# Altium footprint library kalios.PcbLib: 404 footprints (part 5 of 26)
Each footprint in its own frame and in the unit in brackets; x right, y up, seen from the top. Pads: shape width x height; smd on the part's side, far side on the other; paste and mask are expansions set on the pad; w line width, h text height; cw(c..) or ccw(c..) is an arc to the next point about the centre after c.
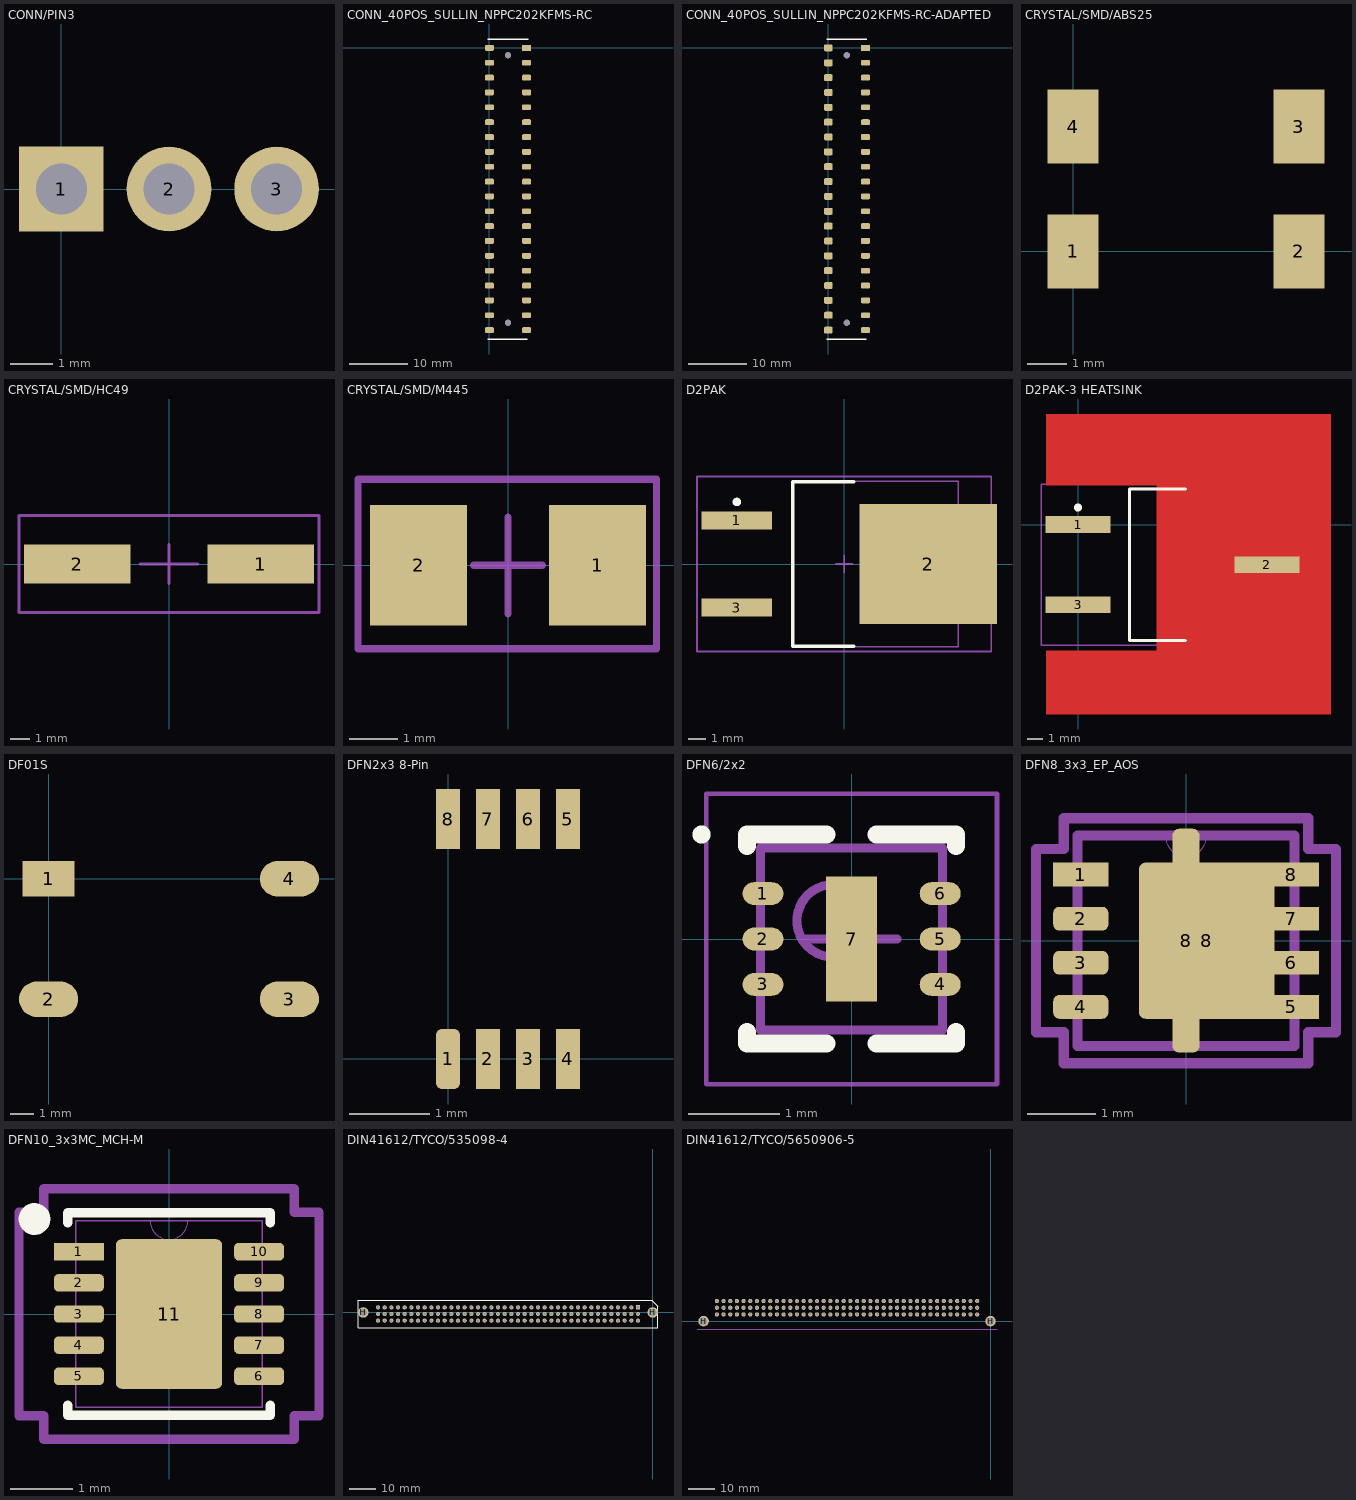
[diagram p4: the footprints below, top view; thin cyan lines are the x and y axes]

## CONN/PIN3 [mm]
pads (3):
  rect 2x2 hole 1.2: 1(0,0)
  round 2 hole 1.2: 2(2.54,0) 3(5.08,0)
Top Designator:
  text ".Designator" at -5.078,-0.508 h1.52

## CONN_40POS_SULLIN_NPPC202KFMS-RC [mm]
pads (42):
  rect 1.56x1 smd: 1(6.35,0)
  rrect50% 1.56x1 smd: 2(0,0) 3(6.35,-2.54) 4(0,-2.54) 5(6.35,-5.08) 6(0,-5.08) 7(6.35,-7.62) 8(0,-7.62) 9(6.35,-10.16) 10(0,-10.16) 11(6.35,-12.7) 12(0,-12.7) 13(6.35,-15.24) 14(0,-15.24) 15(6.35,-17.78) 16(0,-17.78) 17(6.35,-20.32) 18(0,-20.32) 19(6.35,-22.86) 20(0,-22.86) 21(6.35,-25.4) 22(0,-25.4) 23(6.35,-27.94) 24(0,-27.94) 25(6.35,-30.48) 26(0,-30.48) 27(6.35,-33.02) 28(0,-33.02) 29(6.35,-35.56) 30(0,-35.56) 31(6.35,-38.1) 32(0,-38.1) 33(6.35,-40.64) 34(0,-40.64) 35(6.35,-43.18) 36(0,-43.18) 37(6.35,-45.72) 38(0,-45.72) 39(6.35,-48.26) 40(0,-48.26)
  round 1 hole 1.1 unplated: S(3.175,-46.99) S(3.175,-1.27)
Top Overlay:
  lines w0.254: -0.254,-49.784 6.477,-49.784 ; -0.254,1.524 6.604,1.524
Top Designator:
  text ".Designator" at -4.443,-24.638 h1.52
3D body "CONN_40POS_SULLIN_NPPC202KFMS-RC.STEP": height 7.5, standoff 0, extent -0.248,-49.776 6.598,1.524

## CONN_40POS_SULLIN_NPPC202KFMS-RC-ADAPTED [mm]
pads (42):
  rect 1.56x1 smd: 1(6.35,0)
  rrect50% 1.5x1.2 smd: 2(0,0) 4(0,-2.54) 6(0,-5.08) 8(0,-7.62) 10(0,-10.16) 12(0,-12.7) 14(0,-15.24) 16(0,-17.78) 18(0,-20.32) 20(0,-22.86) 22(0,-25.4) 24(0,-27.94) 26(0,-30.48) 28(0,-33.02) 30(0,-35.56) 32(0,-38.1) 34(0,-40.64) 36(0,-43.18) 38(0,-45.72) 40(0,-48.26)
  rrect50% 1.56x1 smd: 3(6.35,-2.54) 5(6.35,-5.08) 7(6.35,-7.62) 9(6.35,-10.16) 11(6.35,-12.7) 13(6.35,-15.24) 15(6.35,-17.78) 17(6.35,-20.32) 19(6.35,-22.86) 21(6.35,-25.4) 23(6.35,-27.94) 25(6.35,-30.48) 27(6.35,-33.02) 29(6.35,-35.56) 31(6.35,-38.1) 33(6.35,-40.64) 35(6.35,-43.18) 37(6.35,-45.72) 39(6.35,-48.26)
  round 1 hole 1.1 unplated: S(3.175,-46.99) S(3.175,-1.27)
Top Overlay:
  lines w0.254: -0.254,-49.784 6.477,-49.784 ; -0.254,1.524 6.604,1.524
Top Designator:
  text ".Designator" at -4.228,-24.638 h1.52
3D body "CONN_40POS_SULLIN_NPPC202KFMS-RC.STEP": height 7.5, standoff 0, extent -0.248,-49.776 6.598,1.524

## CRYSTAL/SMD/ABS25 [mm]
pads (4):
  rect 1.3x1.9 smd: 1(0,0) 2(5.8,0) 3(5.8,3.2) 4(0,3.2)
Top Designator:
  text ".Designator" at -4.759,1.092 h1.52
3D body "ZM206.STEP": height 2.43, standoff -0.1, extent -1.141,-0.362 6.859,3.438

## CRYSTAL/SMD/HC49 [mm]
pads (2):
  rect 5.5x2 smd: 1(4.75,0) 2(-4.75,0)
Top Courtyard:
  lines w0.15: -1.5,0 1.5,0 ; 0,-1 0,1 ; -7.75,-2.5 -7.75,2.5 7.75,2.5 7.75,-2.5 -7.75,-2.5
Top Designator:
  text ".Designator" at -7.618,-0.508 h1.52
3D body "HC49-SMD.STEP": height 2.52, standoff 0.02, extent -6.1,-2.25 6.2,2.25

## CRYSTAL/SMD/M445 [mm]
pads (2):
  rect 2x2.5 smd: 1(1.85,0) 2(-1.85,0)
Top Courtyard:
  lines w0.15: -0.715,0 0.707,0 ; 0,-1.009 0,0.991 ; -3.103,-1.727 -3.103,1.778 3.069,1.778 3.069,-1.727 -3.103,-1.727
Top Designator:
  text ".Designator" at -7.634,-0.482 h1.52
3D body "CRYTAL-SMD.STEP": height 1.35, standoff 0, extent -2.479,-1.574 2.521,1.626

## D2PAK [mm] "D2-PAK, 3-Pads, Body 9.6x9.6mm (max), IPC Medium Density"
height 2.38
pads (3):
  rect 4.1x1.05 smd: 1(-6.25,2.54) 3(-6.25,-2.54)
  rect 8x7 smd: 2(4.902,0)
Top Overlay:
  circle w0.25: c-6.25,3.615 r0.125
  lines w0.2: 0.55,-4.8 -3,-4.8 -3,4.8 0.55,4.8
Top 3D Body:
  lines w0.1: -3,-4.825 6.65,-4.825 6.65,4.825 -3,4.825 -3,-4.825
Top Courtyard:
  lines w0.1: -0.5,0 0.5,0 ; 0,-0.5 0,0.5 ; -8.575,-5.1 8.575,-5.1 8.575,5.1 -8.575,5.1 -8.575,-5.1
Top Designator:
  text ".Designator" at -7.428,-0.508 h1.52
3D body "User Library-DPAK.STEP": height 4.98, standoff -0.03, extent -7.556,-5.08 7.708,5.08

## D2PAK-3 HEATSINK [mm] "D2-PAK, 3-Pads, Body 9.6x9.6mm (max), IPC Medium Density"
height 2.38
pads (3):
  rect 4.1x1.05 smd: 1(0,0) 2(11.963,-2.54) 3(0,-5.08)
Top Layer:
  region: -2,7 16,7 16,-2.5 5,-2.5 5,2.5 -2,2.5
  region: 16,-2.5 16,-12 -2,-12 -2,-8 5,-8 5,-2.5
Top Overlay:
  circle w0.25: c0,1.075 r0.125
  lines w0.2: 6.8,-7.34 3.25,-7.34 3.25,2.26 6.8,2.26
Top Solder:
  region: 16,-2.5 16,-12 -2,-12 -2,-8 5,-8 5,-2.5
  region: -2,7 16,7 16,-2.5 5,-2.5 5,2.5 -2,2.5
Top 3D Body:
  lines w0.1: 3.25,-7.365 3.25,2.285 12.9,2.285 12.9,-7.365 3.25,-7.365
Top Courtyard:
  lines w0.1: 5.75,-2.54 6.75,-2.54 ; 6.25,-3.04 6.25,-2.04 ; -2.325,-7.64 -2.325,2.56 14.825,2.56 14.825,-7.64 -2.325,-7.64
Top Designator:
  text ".Designator" at -0.805,-2.999 h1.52
3D body "D2PAK+DV-T263-101E.STEP": height 10.48, standoff 0.03, extent -1.306,-15.447 13.958,10.464

## DE14MA [mm]
Top Designator:
  text ".Designator" at -7.617,-0.508 h1.52
3D body "DE14MA.STEP": height 0.8, standoff 0, extent -2,-1.51 2,1.51

## DF01S [mm]
pads (4):
  rect 2.2x1.5 smd: 1(0,0)
  oval 2.5x1.5 smd: 2(0,-5.08) 3(10.16,-5.08) 4(10.16,0)
Top Designator:
  text ".Designator" at -2.538,-3.056 h1.52
3D body "SDIP.STEP": height 3.63, standoff 0, extent -0.047,-6.798 9.953,1.702

## DFN2x3 8-Pin [mm]
height 0.9
pads (8):
  rrect50% 0.3x0.75 smd: 1(0,0)
  rect 0.3x0.75 smd: 2(0.5,0) 3(1,0) 4(1.5,0) 5(1.5,3) 6(1,3) 7(0.5,3) 8(0,3)
Top Designator:
  text ".Designator" at -6.867,0.992 h1.52
3D body "DFN2x3 8-Pin.STEP": height 0.9, standoff -0.01, extent -0.247,-0.011 1.753,3.009

## DFN6/2x2 [mm] "QFN, 6-Leads, Body 2.00x2.00mm, Pitch 0.50mm, Thermal Pad 1.37x0.56mm, IPC Medium Density"
height 0.8
pads (7):
  oval 0.45x0.25 smd: 1(-0.975,0.5) 2(-0.975,0) 3(-0.975,-0.5) 4(0.975,-0.5) 5(0.975,0) 6(0.975,0.5)
  rect 0.56x1.37 smd: 7(0,0)
Top Overlay:
  circle w0.1: c-1.65,1.15 r0.05
  lines w0.2: -1.15,-1.025 -1.15,-1.15 -0.275,-1.15 ; -1.15,1.025 -1.15,1.15 -0.275,1.15 ; 0.275,-1.15 1.15,-1.15 1.15,-1.025 ; 0.275,1.15 1.15,1.15 1.15,1.025
Top 3D Body:
  circle w0.1: c-0.2,0.2 r0.4
  lines w0.1: -1,-1 -1,1 1,1 1,-1 -1,-1
Top Courtyard:
  lines w0.05: -1.6,-1.6 -1.6,1.6 1.6,1.6 1.6,-1.6 -1.6,-1.6
  lines w0.1: -0.5,0 0.5,0 ; 0,-0.5 0,0.5
Top Designator:
  text ".Designator" at -7.68,-0.508 h1.52
3D body "DFN-6 2x2mm.STEP": height 0.75, standoff -0.01, extent -1.01,-1 1.01,1

## DFN8_3x3_EP_AOS [mm]
pads (10):
  rect 0.813x0.35 smd paste+0 mask+0: 1(-1.549,0.975) 5(1.549,-0.975) 6(1.549,-0.325) 7(1.549,0.325) 8(1.549,0.975)
  rrect50% 0.813x0.35 smd paste+0 mask+0: 2(-1.549,0.325) 3(-1.549,-0.325)
  rrect50% 0.813x0.35 smd mask+0: 4(-1.549,-0.975)
  rrect50% 0.4x3.3 smd paste+0 mask+0: 8(0,0)
  rrect10% 2x2.3 smd paste+0 mask+0: 8(0.305,0)
Top 3D Body:
  lines w0: -0.305,1.549 ccw(c0,1.549) 0.305,1.549
  lines w0.15: -1.6,-1.549 1.6,-1.549 1.6,1.549 -1.6,1.549 -1.6,-1.549
Top Courtyard:
  lines w0.152: -2.21,-1.351 -2.21,1.351 -1.803,1.351 -1.803,1.803 1.803,1.803 1.803,1.351 2.21,1.351 2.21,-1.351 1.803,-1.351 1.803,-1.803 -1.803,-1.803 -1.803,-1.351 -2.21,-1.351
Top Designator:
  text ".Designator" at -3.499,-0.233 h0.7
3D body: height 0.25, standoff 0, extent 0,0 0.254,0.254
3D body "User Library-DFN8_3x3_0_65Pitch.STEP": height 0.8, standoff 0, extent -1.6,-1.55 1.6,1.55

## DFN10_3x3MC_MCH-M [mm]
pads (11):
  rect 0.8x0.28 smd paste+0 mask+0: 1(-1.445,1)
  rrect50% 0.8x0.28 smd paste+0 mask+0: 2(-1.445,0.5) 3(-1.445,0) 4(-1.445,-0.5) 5(-1.445,-1) 6(1.445,-1) 7(1.445,-0.5) 8(1.445,0) 9(1.445,0.5) 10(1.445,1)
  rrect10% 1.7x2.4 smd paste+0 mask+0: 11(0,0)
Top Overlay:
  circle w0.254: c-2.159,1.524 r0.127
  lines w0.152: -1.626,-1.46 -1.626,-1.626 1.626,-1.626 1.626,-1.46 ; -1.626,1.46 -1.626,1.626 1.626,1.626 1.626,1.46
Top 3D Body:
  lines w0: -0.305,1.499 ccw(c0,1.499) 0.305,1.499
  lines w0.025: -1.499,-1.499 -1.499,1.499 1.499,1.499 1.499,-1.499 -1.499,-1.499
Top Courtyard:
  lines w0.152: -2.407,-1.635 -2.007,-1.635 -2.007,-2.007 2.007,-2.007 2.007,-1.635 2.407,-1.635 2.407,1.635 2.007,1.635 2.007,2.007 -2.007,2.007 -2.007,1.635 -2.407,1.635 -2.407,-1.635
Top Designator:
  text ".Designator" at -7.618,-0.508 h1.52
3D body "DFN10_3x3MC_MCH.step": height -0.42, standoff -1.36, extent -1.499,-1.499 1.499,1.499

## DIN41612/TYCO/535098-4 [mm]
pads (122):
  rect 1.6x1.6 hole 1: A1(-5.613,1.956)
  round 1.6 hole 1: A2(-8.153,1.956) A3(-10.693,1.956) A4(-13.233,1.956) A5(-15.773,1.956) A6(-18.313,1.956) A7(-20.853,1.956) A8(-23.393,1.956) A9(-25.933,1.956) A10(-28.473,1.956) A11(-31.013,1.956) A12(-33.553,1.956) A13(-36.093,1.956) A14(-38.633,1.956) A15(-41.173,1.956) A16(-43.713,1.956) A17(-46.253,1.956) A18(-48.793,1.956) A19(-51.333,1.956) A20(-53.873,1.956) A21(-56.413,1.956) A22(-58.953,1.956) A23(-61.493,1.956) A24(-64.033,1.956) A25(-66.573,1.956) A26(-69.113,1.956) A27(-71.653,1.956) A28(-74.193,1.956) A29(-76.733,1.956) A30(-79.273,1.956) A31(-81.813,1.956) A32(-84.353,1.956) A33(-86.893,1.956) A34(-89.433,1.956) A35(-91.973,1.956) A36(-94.513,1.956) A37(-97.053,1.956) A38(-99.593,1.956) A39(-102.133,1.956) A40(-104.673,1.956) B1(-5.613,-0.584) B2(-8.153,-0.584) B3(-10.693,-0.584) B4(-13.233,-0.584) B5(-15.773,-0.584) B6(-18.313,-0.584) B7(-20.853,-0.584) B8(-23.393,-0.584) B9(-25.933,-0.584) B10(-28.473,-0.584) B11(-31.013,-0.584) B12(-33.553,-0.584) B13(-36.093,-0.584) B14(-38.633,-0.584) B15(-41.173,-0.584) B16(-43.713,-0.584) B17(-46.253,-0.584) B18(-48.793,-0.584) B19(-51.333,-0.584) B20(-53.873,-0.584) B21(-56.413,-0.584) B22(-58.953,-0.584) B23(-61.493,-0.584) B24(-64.033,-0.584) B25(-66.573,-0.584) B26(-69.113,-0.584) B27(-71.653,-0.584) B28(-74.193,-0.584) B29(-76.733,-0.584) B30(-79.273,-0.584) B31(-81.813,-0.584) B32(-84.353,-0.584) B33(-86.893,-0.584) B34(-89.433,-0.584) B35(-91.973,-0.584) B36(-94.513,-0.584) B37(-97.053,-0.584) B38(-99.593,-0.584) B39(-102.133,-0.584) B40(-104.673,-0.584) C1(-5.613,-3.124) C2(-8.153,-3.124) C3(-10.693,-3.124) C4(-13.233,-3.124) C5(-15.773,-3.124) C6(-18.313,-3.124) C7(-20.853,-3.124) C8(-23.393,-3.124) C9(-25.933,-3.124) C10(-28.473,-3.124) C11(-31.013,-3.124) C12(-33.553,-3.124) C13(-36.093,-3.124) C14(-38.633,-3.124) C15(-41.173,-3.124) C16(-43.713,-3.124) C17(-46.253,-3.124) C18(-48.793,-3.124) C19(-51.333,-3.124) C20(-53.873,-3.124) C21(-56.413,-3.124) C22(-58.953,-3.124) C23(-61.493,-3.124) C24(-64.033,-3.124) C25(-66.573,-3.124) C26(-69.113,-3.124) C27(-71.653,-3.124) C28(-74.193,-3.124) C29(-76.733,-3.124) C30(-79.273,-3.124) C31(-81.813,-3.124) C32(-84.353,-3.124) C33(-86.893,-3.124) C34(-89.433,-3.124) C35(-91.973,-3.124) C36(-94.513,-3.124) C37(-97.053,-3.124) C38(-99.593,-3.124) C39(-102.133,-3.124) C40(-104.673,-3.124)
  round 4 hole 2.8: H(-110.31,0) H(0.012,0.002)
Top Overlay:
  lines w0.3: -112.293,-5.918 -112.293,4.75 -0.279,4.75 2.007,2.464 2.007,-5.918 -112.293,-5.918
Top Designator:
  text ".Designator" at -62.761,-1.092 h1.52
3D body "535079-5.STEP": height 11.5, standoff -4.83, extent -112.245,-5.884 1.93,4.716

## DIN41612/TYCO/5650906-5 [mm]
pads (122):
  round 1.6 hole 1: A1(-5.08,2.54) A2(-7.62,2.54) A3(-10.16,2.54) A4(-12.7,2.54) A5(-15.24,2.54) A6(-17.78,2.54) A7(-20.32,2.54) A8(-22.86,2.54) A9(-25.4,2.54) A10(-27.94,2.54) A11(-30.48,2.54) A12(-33.02,2.54) A13(-35.56,2.54) A14(-38.1,2.54) A15(-40.64,2.54) A16(-43.18,2.54) A17(-45.72,2.54) A18(-48.26,2.54) A19(-50.8,2.54) A20(-53.34,2.54) A21(-55.88,2.54) A22(-58.42,2.54) A23(-60.96,2.54) A24(-63.5,2.54) A25(-66.04,2.54) A26(-68.58,2.54) A27(-71.12,2.54) A28(-73.66,2.54) A29(-76.2,2.54) A30(-78.74,2.54) A31(-81.28,2.54) A32(-83.82,2.54) A33(-86.36,2.54) A34(-88.9,2.54) A35(-91.44,2.54) A36(-93.98,2.54) A37(-96.52,2.54) A38(-99.06,2.54) A39(-101.6,2.54) A40(-104.14,2.54) B1(-5.08,5.08) B2(-7.62,5.08) B3(-10.16,5.08) B4(-12.7,5.08) B5(-15.24,5.08) B6(-17.78,5.08) B7(-20.32,5.08) B8(-22.86,5.08) B9(-25.4,5.08) B10(-27.94,5.08) B11(-30.48,5.08) B12(-33.02,5.08) B13(-35.56,5.08) B14(-38.1,5.08) B15(-40.64,5.08) B16(-43.18,5.08) B17(-45.72,5.08) B18(-48.26,5.08) B19(-50.8,5.08) B20(-53.34,5.08) B21(-55.88,5.08) B22(-58.42,5.08) B23(-60.96,5.08) B24(-63.5,5.08) B25(-66.04,5.08) B26(-68.58,5.08) B27(-71.12,5.08) B28(-73.66,5.08) B29(-76.2,5.08) B30(-78.74,5.08) B31(-81.28,5.08) B32(-83.82,5.08) B33(-86.36,5.08) B34(-88.9,5.08) B35(-91.44,5.08) B36(-93.98,5.08) B37(-96.52,5.08) B38(-99.06,5.08) B39(-101.6,5.08) B40(-104.14,5.08) C1(-5.08,7.62) C2(-7.62,7.62) C3(-10.16,7.62) C4(-12.7,7.62) C5(-15.24,7.62) C6(-17.78,7.62) C7(-20.32,7.62) C8(-22.86,7.62) C9(-25.4,7.62) C10(-27.94,7.62) C11(-30.48,7.62) C12(-33.02,7.62) C13(-35.56,7.62) C14(-38.1,7.62) C15(-40.64,7.62) C16(-43.18,7.62) C17(-45.72,7.62) C18(-48.26,7.62) C19(-50.8,7.62) C20(-53.34,7.62) C21(-55.88,7.62) C22(-58.42,7.62) C23(-60.96,7.62) C24(-63.5,7.62) C25(-66.04,7.62) C26(-68.58,7.62) C27(-71.12,7.62) C28(-73.66,7.62) C29(-76.2,7.62) C30(-78.74,7.62) C31(-81.28,7.62) C32(-83.82,7.62) C33(-86.36,7.62) C34(-88.9,7.62) C35(-91.44,7.62) C36(-93.98,7.62) C37(-96.52,7.62) C38(-99.06,7.62) C39(-101.6,7.62) C40(-104.14,7.62)
  round 4 hole 2.8: H(-109.22,0) H(0,0)
Top 3D Body:
  lines w0.254: -111.709,-3.023 2.464,-3.023
Top Designator:
  text ".Designator" at -62.24,-1.305 h1.52
3D body "DIN-41612 5650906-05-3.STEP": height 9.52, standoff -2.58, extent -111.681,-10.116 2.489,7.932